# Altium footprint library WR-TBL_Rising Cage Clamp.PcbLib: 435 footprints (part 18 of 28)
Each footprint in its own frame and in the unit in brackets; x right, y up, seen from the top. Pads: shape width x height; smd on the part's side, far side on the other; paste and mask are expansions set on the pad; w line width, h text height; cw(c..) or ccw(c..) is an arc to the next point about the centre after c.
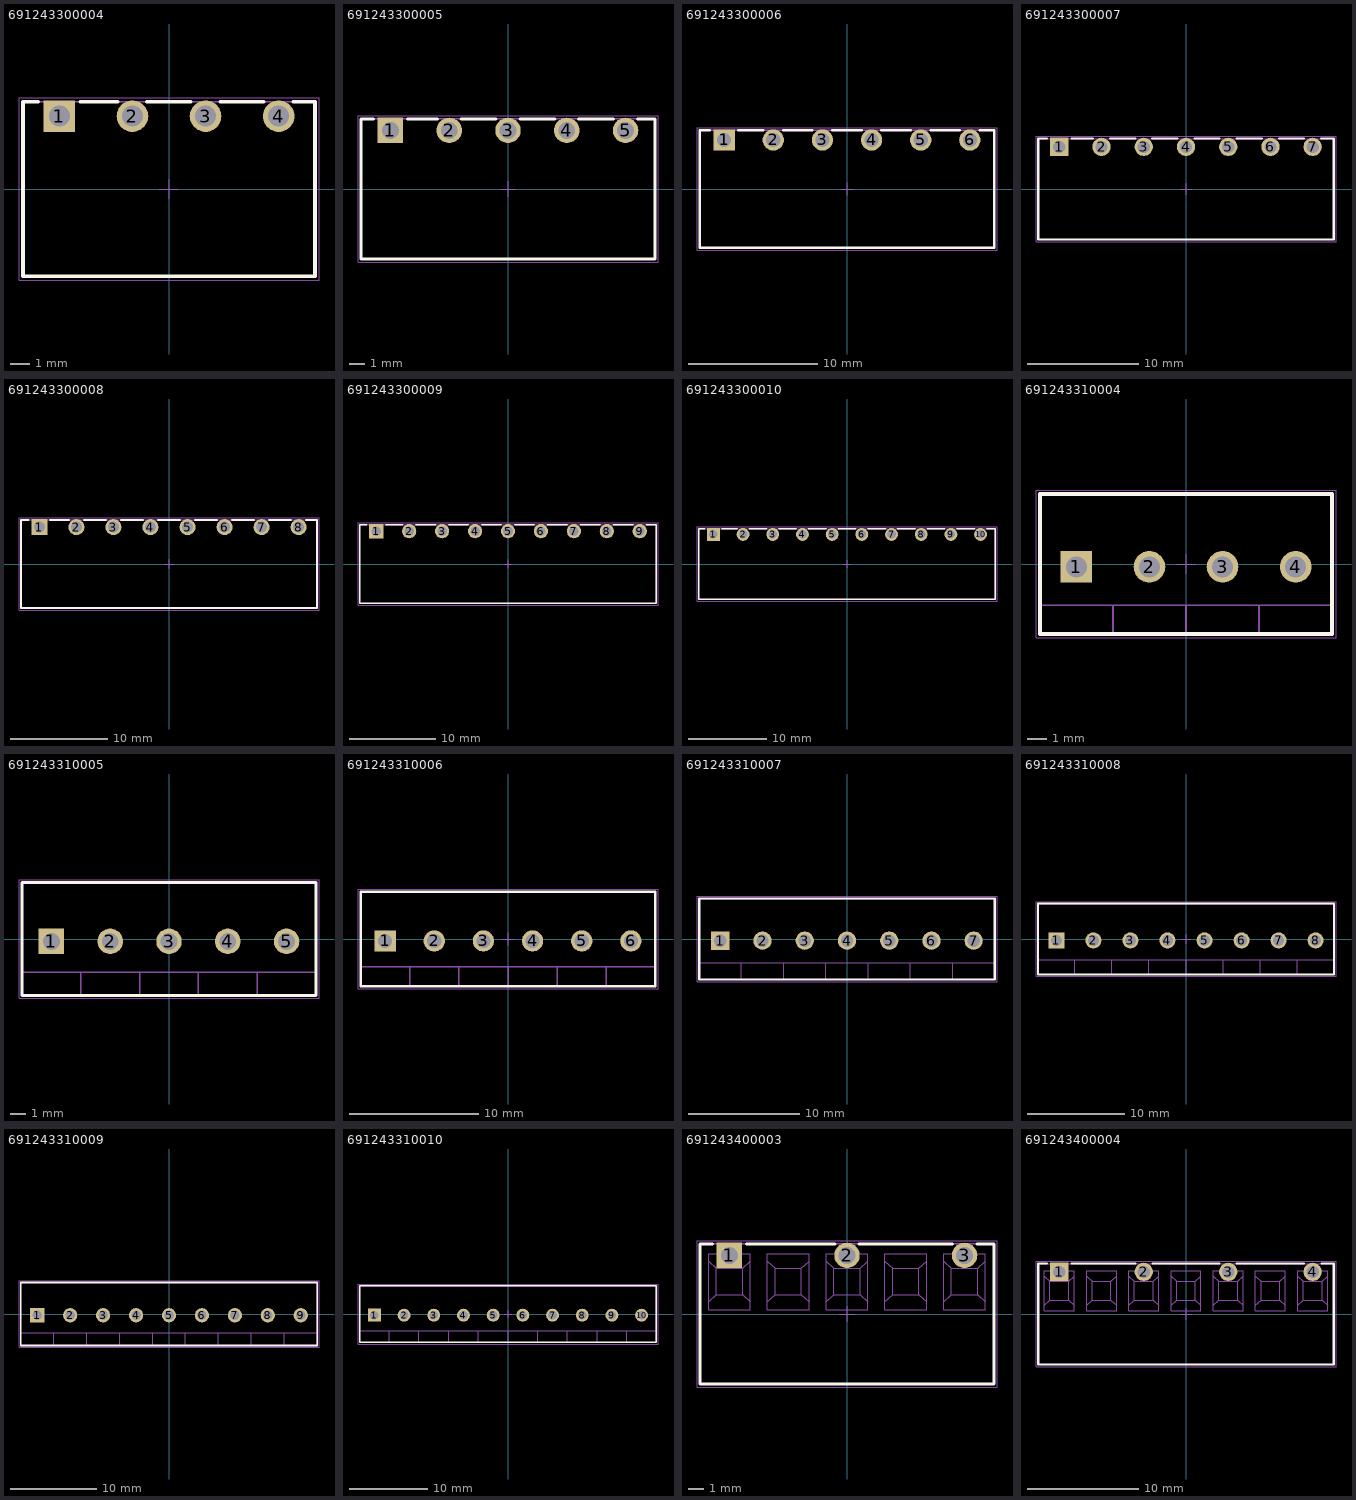
[diagram p17: the footprints below, top view; thin cyan lines are the x and y axes]

## 691243300004 [mm] "Serie 2433 - 3.81 mm _ 4 pins"
height 7.3
pads (4):
  rect 1.65x1.65 hole 1.1: 1(-5.715,3.8)
  round 1.65 hole 1.1: 2(-1.905,3.8) 3(1.905,3.8) 4(5.715,3.8)
Top Overlay:
  lines w0.2: -6.82,4.55 -7.62,4.55 -7.62,-4.55 7.62,-4.55 7.62,4.55 6.48,4.55 ; -4.62,4.55 -2.67,4.55 ; -1.14,4.55 1.13,4.55 ; 2.67,4.55 4.94,4.55
Mechanical 13:
  lines w0.1: -7.62,-4.55 -7.62,4.55 7.62,4.55 7.62,-4.55 -7.62,-4.55
Mechanical 15:
  lines w0.05: -0.5,0 0.5,0 ; 0,-0.5 0,0.5 ; -7.82,-4.75 -7.82,4.75 7.82,4.75 7.82,-4.75 -7.82,-4.75
3D body "691243300004.stp": height 7.32, standoff -3.48, extent -7.6,-4.55 7.64,4.55

## 691243300005 [mm] "Serie 2433 - 3.81 mm _ 5 pins"
height 7.3
pads (5):
  rect 1.65x1.65 hole 1.1: 1(-7.62,3.8)
  round 1.65 hole 1.1: 2(-3.81,3.8) 3(0,3.8) 4(3.81,3.8) 5(7.62,3.8)
Top Overlay:
  lines w0.2: -8.725,4.55 -9.525,4.55 -9.525,-4.55 9.525,-4.55 9.525,4.55 8.385,4.55 ; -6.525,4.55 -4.575,4.55 ; -3.045,4.55 -0.775,4.55 ; 0.765,4.55 3.035,4.55 ; 4.575,4.55 6.845,4.55
Mechanical 13:
  lines w0.1: -9.525,-4.55 9.525,-4.55 9.525,4.55 -9.525,4.55 -9.525,-4.55
Mechanical 15:
  lines w0.05: -0.5,0 0.5,0 ; 0,-0.5 0,0.5 ; -9.725,-4.75 9.725,-4.75 9.725,4.75 -9.725,4.75 -9.725,-4.75
3D body "691243300005.stp": height 7.32, standoff -3.48, extent -9.505,-4.55 9.545,4.55

## 691243300006 [mm] "Serie 2433 - 3.81 mm _ 6 pins"
height 7.3
pads (6):
  rect 1.65x1.65 hole 1.1: 1(-9.525,3.8)
  round 1.65 hole 1.1: 2(-5.715,3.8) 3(-1.905,3.8) 4(1.905,3.8) 5(5.715,3.8) 6(9.525,3.8)
Top Overlay:
  lines w0.2: -10.63,4.55 -11.43,4.55 -11.43,-4.55 11.43,-4.55 11.43,4.55 10.29,4.55 ; -8.43,4.55 -6.48,4.55 ; -4.95,4.55 -2.68,4.55 ; -1.14,4.55 1.13,4.55 ; 2.67,4.55 4.94,4.55 ; 6.48,4.55 8.75,4.55
Mechanical 13:
  lines w0.1: -11.43,-4.55 -11.43,4.55 11.43,4.55 11.43,-4.55 -11.43,-4.55
Mechanical 15:
  lines w0.05: -0.5,0 0.5,0 ; 0,-0.5 0,0.5 ; -11.63,-4.75 -11.63,4.75 11.63,4.75 11.63,-4.75 -11.63,-4.75
3D body "691243300006.stp": height 7.32, standoff -3.48, extent -11.41,-4.55 11.45,4.55

## 691243300007 [mm] "Serie 2433 - 3.81 mm _ 7 pins"
height 7.3
pads (7):
  rect 1.65x1.65 hole 1.1: 1(-11.43,3.8)
  round 1.65 hole 1.1: 2(-7.62,3.8) 3(-3.81,3.8) 4(0,3.8) 5(3.81,3.8) 6(7.62,3.8) 7(11.43,3.8)
Top Overlay:
  lines w0.2: -12.535,4.55 -13.335,4.55 -13.335,-4.55 13.335,-4.55 13.335,4.55 12.195,4.55 ; -10.335,4.55 -8.385,4.55 ; -6.855,4.55 -4.585,4.55 ; -3.045,4.55 -0.775,4.55 ; 0.765,4.55 3.035,4.55 ; 4.575,4.55 6.845,4.55 ; 8.385,4.55 10.655,4.55
Mechanical 13:
  lines w0.1: -13.335,-4.55 13.335,-4.55 13.335,4.55 -13.335,4.55 -13.335,-4.55
Mechanical 15:
  lines w0.05: -0.5,0 0.5,0 ; 0,-0.5 0,0.5 ; -13.535,-4.75 13.535,-4.75 13.535,4.75 -13.535,4.75 -13.535,-4.75
3D body "691243300007.stp": height 7.32, standoff -3.48, extent -13.315,-4.55 13.355,4.55

## 691243300008 [mm] "Serie 2433 - 3.81 mm _ 8 pins"
height 7.3
pads (8):
  rect 1.65x1.65 hole 1.1: 1(-13.335,3.8)
  round 1.65 hole 1.1: 2(-9.525,3.8) 3(-5.715,3.8) 4(-1.905,3.8) 5(1.905,3.8) 6(5.715,3.8) 7(9.525,3.8) 8(13.335,3.8)
Top Overlay:
  lines w0.2: -14.44,4.55 -15.24,4.55 -15.24,-4.55 15.24,-4.55 15.24,4.55 14.1,4.55 ; -12.24,4.55 -10.29,4.55 ; -8.76,4.55 -6.49,4.55 ; -4.95,4.55 -2.68,4.55 ; -1.14,4.55 1.13,4.55 ; 2.67,4.55 4.94,4.55 ; 6.48,4.55 8.75,4.55 ; 10.29,4.55 12.56,4.55
Mechanical 13:
  lines w0.1: -15.24,-4.55 -15.24,4.55 15.24,4.55 15.24,-4.55 -15.24,-4.55
Mechanical 15:
  lines w0.05: -0.5,0 0.5,0 ; 0,-0.5 0,0.5 ; -15.44,-4.75 -15.44,4.75 15.44,4.75 15.44,-4.75 -15.44,-4.75
3D body "691243300008.stp": height 7.32, standoff -3.48, extent -15.22,-4.55 15.26,4.55

## 691243300009 [mm] "Serie 2433 - 3.81 mm _ 9 pins"
height 7.3
pads (9):
  rect 1.65x1.65 hole 1.1: 1(-15.24,3.8)
  round 1.65 hole 1.1: 2(-11.43,3.8) 3(-7.62,3.8) 4(-3.81,3.8) 5(0,3.8) 6(3.81,3.8) 7(7.62,3.8) 8(11.43,3.8) 9(15.24,3.8)
Top Overlay:
  lines w0.2: -16.345,4.55 -17.145,4.55 -17.145,-4.55 17.145,-4.55 17.145,4.55 16.005,4.55 ; -14.145,4.55 -12.195,4.55 ; -10.665,4.55 -8.395,4.55 ; -6.855,4.55 -4.585,4.55 ; -3.045,4.55 -0.775,4.55 ; 0.765,4.55 3.035,4.55 ; 4.575,4.55 6.845,4.55 ; 8.385,4.55 10.655,4.55 ; 12.195,4.55 14.465,4.55
Mechanical 13:
  lines w0.1: -17.145,-4.55 17.145,-4.55 17.145,4.55 -17.145,4.55 -17.145,-4.55
Mechanical 15:
  lines w0.05: -0.5,0 0.5,0 ; 0,-0.5 0,0.5 ; -17.345,-4.75 17.345,-4.75 17.345,4.75 -17.345,4.75 -17.345,-4.75
3D body "691243300009.stp": height 7.32, standoff -3.48, extent -17.125,-4.55 17.165,4.55

## 691243300010 [mm] "Serie 2433 - 3.81 mm _ 10 pins"
height 7.3
pads (10):
  rect 1.65x1.65 hole 1.1: 1(-17.145,3.8)
  round 1.65 hole 1.1: 2(-13.335,3.8) 3(-9.525,3.8) 4(-5.715,3.8) 5(-1.905,3.8) 6(1.905,3.8) 7(5.715,3.8) 8(9.525,3.8) 9(13.335,3.8) 10(17.145,3.8)
Top Overlay:
  lines w0.2: -18.25,4.55 -19.05,4.55 -19.05,-4.55 19.05,-4.55 19.05,4.55 17.91,4.55 ; -16.05,4.55 -14.1,4.55 ; -12.57,4.55 -10.3,4.55 ; -8.76,4.55 -6.49,4.55 ; -4.95,4.55 -2.68,4.55 ; -1.14,4.55 1.13,4.55 ; 2.67,4.55 4.94,4.55 ; 6.48,4.55 8.75,4.55 ; 10.29,4.55 12.56,4.55 ; 14.1,4.55 16.37,4.55
Mechanical 13:
  lines w0.1: -19.05,-4.55 -19.05,4.55 19.05,4.55 19.05,-4.55 -19.05,-4.55
Mechanical 15:
  lines w0.05: -0.5,0 0.5,0 ; 0,-0.5 0,0.5 ; -19.25,-4.75 -19.25,4.75 19.25,4.75 19.25,-4.75 -19.25,-4.75
3D body "691243300010.stp": height 7.32, standoff -3.48, extent -19.03,-4.55 19.07,4.55

## 691243310004 [mm] "Serie 2433 - 3.81 mm _ 4 pins"
height 9.1
pads (4):
  rect 1.65x1.65 hole 1.1: 1(-5.715,-0.15)
  round 1.65 hole 1.1: 2(-1.905,-0.15) 3(1.905,-0.15) 4(5.715,-0.15)
Top Overlay:
  lines w0.2: -7.62,-3.65 -7.62,3.65 7.62,3.65 7.62,-3.65 -7.62,-3.65
Mechanical 13:
  lines w0.1: -7.62,-2.15 7.62,-2.15 ; -3.81,-3.65 -3.81,-2.15 ; 0,-3.65 0,-2.15 ; 3.81,-3.65 3.81,-2.15 ; -7.62,-3.65 7.62,-3.65 7.62,3.65 -7.62,3.65 -7.62,-3.65
Mechanical 15:
  lines w0.05: -0.5,0 0.5,0 ; 0,-0.5 0,0.5 ; -7.82,-3.85 -7.82,3.85 7.82,3.85 7.82,-3.85 -7.82,-3.85
3D body "691243310004.stp": height 9.15, standoff -3.45, extent -7.62,-3.65 7.62,3.65

## 691243310005 [mm] "Serie 2433 - 3.81 mm _ 5 pins"
height 9.1
pads (5):
  rect 1.65x1.65 hole 1.1: 1(-7.62,-0.15)
  round 1.65 hole 1.1: 2(-3.81,-0.15) 3(0,-0.15) 4(3.81,-0.15) 5(7.62,-0.15)
Top Overlay:
  lines w0.2: -9.525,-3.65 -9.525,3.65 9.525,3.65 9.525,-3.65 -9.525,-3.65
Mechanical 13:
  lines w0.1: -9.525,-2.15 9.525,-2.15 ; -5.715,-3.65 -5.715,-2.15 ; -1.905,-3.65 -1.905,-2.15 ; 1.905,-3.65 1.905,-2.15 ; 5.715,-3.65 5.715,-2.15 ; -9.525,-3.65 9.525,-3.65 9.525,3.65 -9.525,3.65 -9.525,-3.65
Mechanical 15:
  lines w0.05: -0.5,0 0.5,0 ; 0,-0.5 0,0.5 ; -9.725,-3.85 -9.725,3.85 9.725,3.85 9.725,-3.85 -9.725,-3.85
3D body "691243310005.stp": height 9.15, standoff -3.45, extent -9.525,-3.65 9.525,3.65

## 691243310006 [mm] "Serie 2433 - 3.81 mm _ 6 pins"
height 9.1
pads (6):
  rect 1.65x1.65 hole 1.1: 1(-9.525,-0.15)
  round 1.65 hole 1.1: 2(-5.715,-0.15) 3(-1.905,-0.15) 4(1.905,-0.15) 5(5.715,-0.15) 6(9.525,-0.15)
Top Overlay:
  lines w0.2: -11.43,-3.65 -11.43,3.65 11.43,3.65 11.43,-3.65 -11.43,-3.65
Mechanical 13:
  lines w0.1: -11.43,-2.15 11.43,-2.15 ; -7.62,-3.65 -7.62,-2.15 ; -3.81,-3.65 -3.81,-2.15 ; 0,-3.65 0,-2.15 ; 3.81,-3.65 3.81,-2.15 ; 7.62,-3.65 7.62,-2.15 ; -11.43,-3.65 11.43,-3.65 11.43,3.65 -11.43,3.65 -11.43,-3.65
Mechanical 15:
  lines w0.05: -0.5,0 0.5,0 ; 0,-0.5 0,0.5 ; -11.63,-3.85 -11.63,3.85 11.63,3.85 11.63,-3.85 -11.63,-3.85
3D body "691243310006.stp": height 9.15, standoff -3.45, extent -11.43,-3.65 11.43,3.65

## 691243310007 [mm] "Serie 2433 - 3.81 mm _ 7 pins"
height 9.1
pads (7):
  rect 1.65x1.65 hole 1.1: 1(-11.43,-0.15)
  round 1.65 hole 1.1: 2(-7.62,-0.15) 3(-3.81,-0.15) 4(0,-0.15) 5(3.81,-0.15) 6(7.62,-0.15) 7(11.43,-0.15)
Top Overlay:
  lines w0.2: -13.335,-3.65 13.335,-3.65 13.335,3.65 -13.335,3.65 -13.335,-3.65
Mechanical 13:
  lines w0.1: -13.335,-2.15 13.335,-2.15 ; -9.525,-3.65 -9.525,-2.15 ; -5.715,-3.65 -5.715,-2.15 ; -1.905,-3.65 -1.905,-2.15 ; 1.905,-3.65 1.905,-2.15 ; 5.715,-3.65 5.715,-2.15 ; 9.525,-3.65 9.525,-2.15 ; -13.335,-3.65 -13.335,3.65 13.335,3.65 13.335,-3.65 -13.335,-3.65
Mechanical 15:
  lines w0.05: -0.5,0 0.5,0 ; 0,-0.5 0,0.5 ; -13.535,-3.85 13.535,-3.85 13.535,3.85 -13.535,3.85 -13.535,-3.85
3D body "691243310007.stp": height 9.15, standoff -3.45, extent -13.335,-3.65 13.335,3.65

## 691243310008 [mm] "Serie 2433 - 3.81 mm _ 8 pins"
height 9.1
pads (8):
  rect 1.65x1.65 hole 1.1: 1(-13.335,-0.15)
  round 1.65 hole 1.1: 2(-9.525,-0.15) 3(-5.715,-0.15) 4(-1.905,-0.15) 5(1.905,-0.15) 6(5.715,-0.15) 7(9.525,-0.15) 8(13.335,-0.15)
Top Overlay:
  lines w0.2: -15.24,-3.65 -15.24,3.65 15.24,3.65 15.24,-3.65 -15.24,-3.65
Mechanical 13:
  lines w0.1: -15.24,-2.15 15.24,-2.15 ; -11.43,-3.65 -11.43,-2.15 ; -7.62,-3.65 -7.62,-2.15 ; -3.81,-3.65 -3.81,-2.15 ; 0,-3.65 0,-2.15 ; 3.81,-3.65 3.81,-2.15 ; 7.62,-3.65 7.62,-2.15 ; 11.43,-3.65 11.43,-2.15 ; -15.24,-3.65 15.24,-3.65 15.24,3.65 -15.24,3.65 -15.24,-3.65
Mechanical 15:
  lines w0.05: -0.5,0 0.5,0 ; 0,-0.5 0,0.5 ; -15.44,-3.85 -15.44,3.85 15.44,3.85 15.44,-3.85 -15.44,-3.85
3D body "691243310008.stp": height 9.15, standoff -3.45, extent -15.24,-3.65 15.24,3.65

## 691243310009 [mm] "Serie 2433 - 3.81 mm _ 9 pins"
height 9.1
pads (9):
  rect 1.65x1.65 hole 1.1: 1(-15.24,-0.15)
  round 1.65 hole 1.1: 2(-11.43,-0.15) 3(-7.62,-0.15) 4(-3.81,-0.15) 5(0,-0.15) 6(3.81,-0.15) 7(7.62,-0.15) 8(11.43,-0.15) 9(15.24,-0.15)
Top Overlay:
  lines w0.2: -17.145,-3.65 17.145,-3.65 17.145,3.65 -17.145,3.65 -17.145,-3.65
Mechanical 13:
  lines w0.1: -17.145,-2.15 17.145,-2.15 ; -13.335,-3.65 -13.335,-2.15 ; -9.525,-3.65 -9.525,-2.15 ; -5.715,-3.65 -5.715,-2.15 ; -1.905,-3.65 -1.905,-2.15 ; 1.905,-3.65 1.905,-2.15 ; 5.715,-3.65 5.715,-2.15 ; 9.525,-3.65 9.525,-2.15 ; 13.335,-3.65 13.335,-2.15 ; -17.145,-3.65 -17.145,3.65 17.145,3.65 17.145,-3.65 -17.145,-3.65
Mechanical 15:
  lines w0.05: -0.5,0 0.5,0 ; 0,-0.5 0,0.5 ; -17.345,-3.85 17.345,-3.85 17.345,3.85 -17.345,3.85 -17.345,-3.85
3D body "691243310009.stp": height 9.15, standoff -3.45, extent -17.145,-3.65 17.145,3.65

## 691243310010 [mm] "Serie 2433 - 3.81 mm _ 10 pins"
height 9.1
pads (10):
  rect 1.65x1.65 hole 1.1: 1(-17.145,-0.15)
  round 1.65 hole 1.1: 2(-13.335,-0.15) 3(-9.525,-0.15) 4(-5.715,-0.15) 5(-1.905,-0.15) 6(1.905,-0.15) 7(5.715,-0.15) 8(9.525,-0.15) 9(13.335,-0.15) 10(17.145,-0.15)
Top Overlay:
  lines w0.2: -19.05,-3.65 -19.05,3.65 19.05,3.65 19.05,-3.65 -19.05,-3.65
Mechanical 13:
  lines w0.1: -19.05,-2.15 19.05,-2.15 ; -15.24,-3.65 -15.24,-2.15 ; -11.43,-3.65 -11.43,-2.15 ; -7.62,-3.65 -7.62,-2.15 ; -3.81,-3.65 -3.81,-2.15 ; 0,-3.65 0,-2.15 ; 3.81,-3.65 3.81,-2.15 ; 7.62,-3.65 7.62,-2.15 ; 11.43,-3.65 11.43,-2.15 ; 15.24,-3.65 15.24,-2.15 ; -19.05,-3.65 19.05,-3.65 19.05,3.65 -19.05,3.65 -19.05,-3.65
Mechanical 15:
  lines w0.05: -0.5,0 0.5,0 ; 0,-0.5 0,0.5 ; -19.25,-3.85 -19.25,3.85 19.25,3.85 19.25,-3.85 -19.25,-3.85
3D body "691243310010.stp": height 9.15, standoff -3.45, extent -19.05,-3.65 19.05,3.65

## 691243400003 [mm] "Serie 2434 - 7.62 mm _ 3 pins"
height 7.3
pads (3):
  rect 1.65x1.65 hole 1.1: 1(-7.62,3.8)
  round 1.65 hole 1.1: 2(0,3.8) 3(7.62,3.8)
Top Overlay:
  lines w0.2: -8.725,4.55 -9.525,4.55 -9.525,-4.55 9.525,-4.55 9.525,4.55 8.415,4.55 ; -6.515,4.55 -0.775,4.55 ; 0.775,4.55 6.825,4.55
Mechanical 13:
  lines w0.05: -8.97,0.79 -8.465,1.245 ; -8.97,3.41 -8.465,2.955 ; -6.775,1.245 -6.27,0.79 ; -6.775,2.955 -6.27,3.41 ; -5.16,0.79 -4.655,1.245 ; -5.16,3.41 -4.655,2.955 ; -2.965,1.245 -2.46,0.79 ; -2.965,2.955 -2.46,3.41 ; -1.35,0.79 -0.845,1.245 ; -1.35,3.41 -0.845,2.955 ; 0.845,1.245 1.35,0.79 ; 0.845,2.955 1.35,3.41 ; 2.46,0.79 2.965,1.245 ; 2.46,3.41 2.965,2.955 ; 4.655,1.245 5.16,0.79 ; 4.655,2.955 5.16,3.41 ; 6.27,0.79 6.775,1.245 ; 6.27,3.41 6.775,2.955 ; 8.465,1.245 8.97,0.79 ; 8.465,2.955 8.97,3.41 ; -8.97,0.29 -8.97,3.91 -6.27,3.91 -6.27,0.29 -8.97,0.29 ; -8.47,1.25 -8.47,2.95 -6.77,2.95 -6.77,1.25 -8.47,1.25 ; -5.16,0.29 -2.46,0.29 -2.46,3.91 -5.16,3.91 -5.16,0.29 ; -4.66,1.25 -2.96,1.25 -2.96,2.95 -4.66,2.95 -4.66,1.25 ; -1.35,0.29 1.35,0.29 1.35,3.91 -1.35,3.91 -1.35,0.29 ; -0.85,1.25 0.85,1.25 0.85,2.95 -0.85,2.95 -0.85,1.25 ; 2.46,0.29 5.16,0.29 5.16,3.91 2.46,3.91 2.46,0.29 ; 2.96,1.25 4.66,1.25 4.66,2.95 2.96,2.95 2.96,1.25 ; 6.27,0.29 8.97,0.29 8.97,3.91 6.27,3.91 6.27,0.29 ; 6.77,1.25 8.47,1.25 8.47,2.95 6.77,2.95 6.77,1.25
  lines w0.1: -9.525,-4.55 9.525,-4.55 9.525,4.55 -9.525,4.55 -9.525,-4.55
Mechanical 15:
  lines w0.05: -0.5,0 0.5,0 ; 0,-0.5 0,0.5 ; -9.725,-4.75 -9.725,4.75 9.725,4.75 9.725,-4.75 -9.725,-4.75
3D body "691243400003.stp": height 7.35, standoff -3.45, extent -9.525,-4.55 9.525,4.55

## 691243400004 [mm] "Serie 2434 - 7.62 mm _ 4 pins"
height 7.3
pads (4):
  rect 1.65x1.65 hole 1.1: 1(-11.43,3.8)
  round 1.65 hole 1.1: 2(-3.81,3.8) 3(3.81,3.8) 4(11.43,3.8)
Top Overlay:
  lines w0.2: -12.535,4.55 -13.335,4.55 -13.335,-4.55 13.335,-4.55 13.335,4.55 12.225,4.55 ; -10.325,4.55 -4.585,4.55 ; -3.035,4.55 3.015,4.55 ; 4.585,4.55 10.635,4.55
Mechanical 13:
  lines w0.05: -12.78,0.79 -12.275,1.245 ; -12.78,3.41 -12.275,2.955 ; -10.585,1.245 -10.08,0.79 ; -10.585,2.955 -10.08,3.41 ; -8.97,0.79 -8.465,1.245 ; -8.97,3.41 -8.465,2.955 ; -6.775,1.245 -6.27,0.79 ; -6.775,2.955 -6.27,3.41 ; -5.16,0.79 -4.655,1.245 ; -5.16,3.41 -4.655,2.955 ; -2.965,1.245 -2.46,0.79 ; -2.965,2.955 -2.46,3.41 ; -1.35,0.79 -0.845,1.245 ; -1.35,3.41 -0.845,2.955 ; 0.845,1.245 1.35,0.79 ; 0.845,2.955 1.35,3.41 ; 2.46,0.79 2.965,1.245 ; 2.46,3.41 2.965,2.955 ; 4.655,1.245 5.16,0.79 ; 4.655,2.955 5.16,3.41 ; 6.27,0.79 6.775,1.245 ; 6.27,3.41 6.775,2.955 ; 8.465,1.245 8.97,0.79 ; 8.465,2.955 8.97,3.41 ; 10.08,0.79 10.585,1.245 ; 10.08,3.41 10.585,2.955 ; 12.275,1.245 12.78,0.79 ; 12.275,2.955 12.78,3.41 ; -12.78,0.29 -12.78,3.91 -10.08,3.91 -10.08,0.29 -12.78,0.29 ; -12.28,1.25 -12.28,2.95 -10.58,2.95 -10.58,1.25 -12.28,1.25 ; -8.97,0.29 -6.27,0.29 -6.27,3.91 -8.97,3.91 -8.97,0.29 ; -8.47,1.25 -6.77,1.25 -6.77,2.95 -8.47,2.95 -8.47,1.25 ; -5.16,0.29 -2.46,0.29 -2.46,3.91 -5.16,3.91 -5.16,0.29 ; -4.66,1.25 -2.96,1.25 -2.96,2.95 -4.66,2.95 -4.66,1.25 ; -1.35,0.29 1.35,0.29 1.35,3.91 -1.35,3.91 -1.35,0.29 ; -0.85,1.25 0.85,1.25 0.85,2.95 -0.85,2.95 -0.85,1.25 ; 2.46,0.29 5.16,0.29 5.16,3.91 2.46,3.91 2.46,0.29 ; 2.96,1.25 4.66,1.25 4.66,2.95 2.96,2.95 2.96,1.25 ; 6.27,0.29 6.27,3.91 8.97,3.91 8.97,0.29 6.27,0.29 ; 6.77,1.25 6.77,2.95 8.47,2.95 8.47,1.25 6.77,1.25 ; 10.08,0.29 10.08,3.91 12.78,3.91 12.78,0.29 10.08,0.29 ; 10.58,1.25 10.58,2.95 12.28,2.95 12.28,1.25 10.58,1.25
  lines w0.1: -13.335,-4.55 13.335,-4.55 13.335,4.55 -13.335,4.55 -13.335,-4.55
Mechanical 15:
  lines w0.05: -0.5,0 0.5,0 ; 0,-0.5 0,0.5 ; -13.535,-4.75 -13.535,4.75 13.535,4.75 13.535,-4.75 -13.535,-4.75
3D body "691243400004.stp": height 7.35, standoff -3.45, extent -13.335,-4.55 13.335,4.55